# Altium footprint library Standard.PcbLib: 148 footprints (part 7 of 10)
Each footprint in its own frame and in the unit in brackets; x right, y up, seen from the top. Pads: shape width x height; smd on the part's side, far side on the other; paste and mask are expansions set on the pad; w line width, h text height; cw(c..) or ccw(c..) is an arc to the next point about the centre after c.
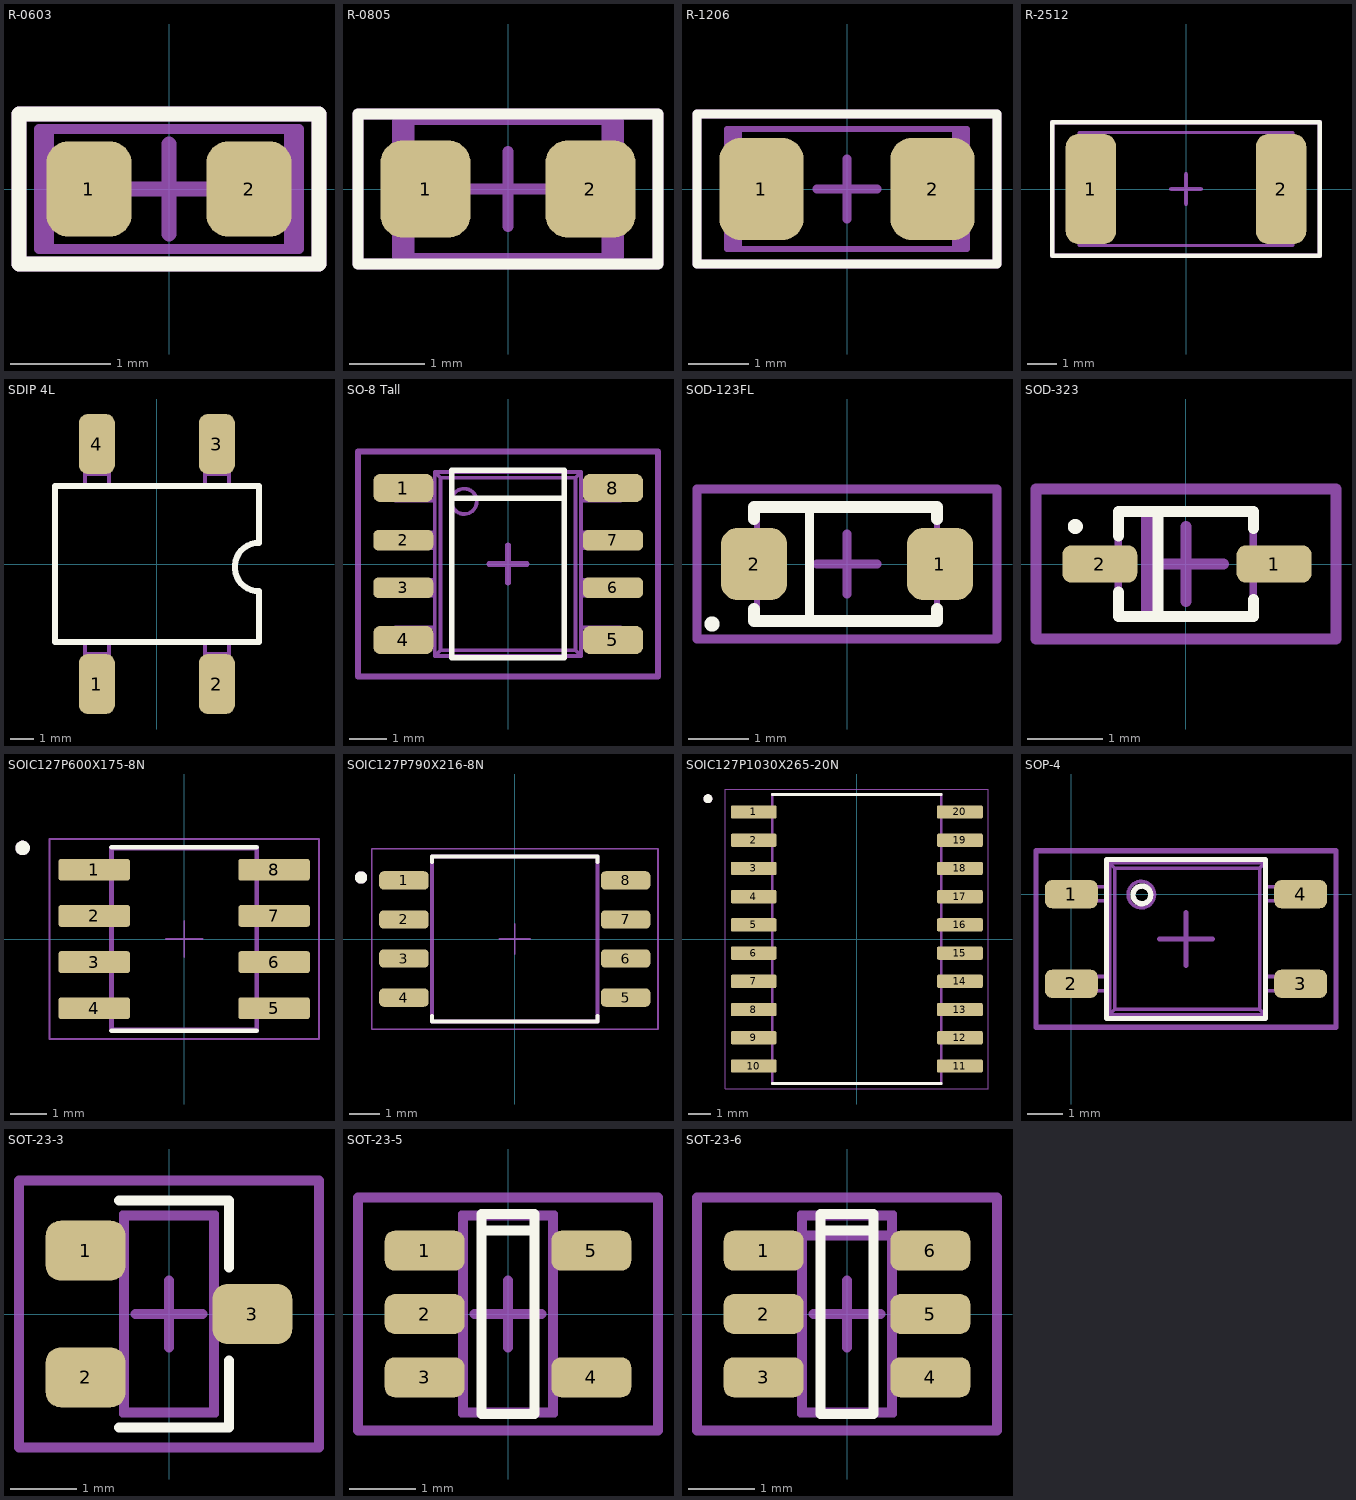
[diagram p6: the footprints below, top view; thin cyan lines are the x and y axes]

## R-0603 [mm] "Chip Capacitor, 2-Leads, Body 1,60x0,83mm, IPC Medium Density"
height 0.6
pads (2):
  rrect50% 0.85x0.95 smd: 1(-0.8,0) 2(0.8,0)
Top Overlay:
  lines w0.15: -1.5,-0.75 -1.5,0.75 0,0.75 1.5,0.75 1.5,-0.75 0,-0.75 -1.5,-0.75
Top Assembly:
  lines w0.1: -1.2,-0.6 -1.2,0.6 ; 1.2,-0.6 1.2,0.6 ; -1.3,-0.6 -1.3,0.6 1.3,0.6 1.3,-0.6 -1.3,-0.6
Top Component Outline:
  lines w0.15: -0.45,0 0.45,0 ; 0,-0.45 0,0.45 ; -1.5,-0.75 -1.5,0.75 1.5,0.75 1.5,-0.75 -1.5,-0.75
3D body "SMD R-0603.STEP": height 0.45, standoff -0.01, extent -0.8,-0.4 0.8,0.4

## R-0805 [mm] "Chip Resistor, 2-Leads, Body 2,00x1,25mm, IPC Medium Density"
height 0.7
pads (2):
  rrect50% 1.2x1.3 smd: 1(-1.1,0) 2(1.1,0)
Top Overlay:
  lines w0.15: -2,-1 -2,1 2,1 2,-1 -2,-1
Top Assembly:
  rectangle: 1.3,-0.9 1.5,0.9
  rectangle: -1.5,-0.9 -1.3,0.9
  lines w0.1: -1.3,-0.9 -1.3,0.9 ; 1.3,-0.9 1.3,0.9 ; -1.5,-0.9 1.5,-0.9 1.5,0.9 -1.5,0.9 -1.5,-0.9
Top Component Outline:
  lines w0.15: -0.5,0 0.5,0 ; 0,-0.5 0,0.5 ; -2,-1 -2,1 2,1 2,-1 -2,-1
3D body "R-0805.STEP": height 0.6, standoff 0, extent -1,-0.625 1,0.625

## R-1206 [mm] "Chip Resistor, 2-Leads, Body 3,20x1,60mm, IPC Medium Density"
height 0.7
pads (2):
  rrect50% 1.4x1.7 smd: 1(-1.425,0) 2(1.425,0)
Top Overlay:
  lines w0.15: -2.5,-1.25 -2.5,1.25 -0.45,1.25 0.45,1.25 2.5,1.25 2.5,-1.25 0.45,-1.25 -0.45,-1.25 -2.5,-1.25
Top Assembly:
  rectangle: 1.75,-1 1.95,1
  rectangle: -1.95,-1 -1.75,1
  lines w0.1: -2,-1 -2,1 2,1 2,-1 -2,-1
Top Component Outline:
  lines w0.15: -0.5,0 0.5,0 ; 0,-0.5 0,0.5 ; -2.5,-1.25 -2.5,1.25 2.5,1.25 2.5,-1.25 -2.5,-1.25
3D body "R-1206 (2).STEP": height 0.6, standoff 0, extent -1.6,-0.8 1.6,0.8

## R-2512 [mm]
height 0.7
pads (2):
  rrect50% 1.7x3.7 smd: 1(-3.2,0) 2(3.2,0)
Top Overlay:
  lines w0.15: -4.5,-2.25 4.5,-2.25 4.5,2.25 -4.5,2.25 -4.5,-2.25
Top Assembly:
  rectangle: -3.6,-1.9 -2.8,1.9
  rectangle: 2.8,-1.9 3.6,1.9
  lines w0.1: -3.3,-1.9 -3.3,1.9 ; 3.3,-1.9 3.3,1.9 ; -3.6,-1.9 3.6,-1.9 3.6,1.9 -3.6,1.9 -3.6,-1.9
Top Component Outline:
  lines w0.15: -0.5,0 0.5,0 ; 0,-0.5 0,0.5 ; -4.5,-2.25 4.5,-2.25 4.5,2.25 -4.5,2.25 -4.5,-2.25
3D body "SMD R-2512.STEP": height 0.62, standoff 0, extent -3.16,-1.6 3.16,1.6

## SDIP 4L [mil] "4-LEAD,SDIP,6.5mm WIDE"
pads (4):
  rrect50% 60x100 smd: 1(-100,-200) 2(100,-200) 3(100,200) 4(-100,200)
Top Overlay:
  lines w10: 170,-45.31 cw(c170,-5) 170,35.31 ; 170,-45 170,-130 -170,-130 -170,130 170,130 170,35
Top Assembly:
  lines w7.01: -120,-150 -80,-150 ; -120,-130 -120,-190 -80,-190 -80,-130 ; -120,130 -120,190 -80,190 -80,130 ; -120,150 -80,150 ; 80,-150 120,-150 ; 80,-130 80,-190 120,-190 120,-130 ; 80,130 80,190 120,190 120,130 ; 80,150 120,150 ; 170,-45.31 cw(c170,-5) 170,35.31 ; 170,-45 170,-130 -170,-130 -170,130 170,130 170,35
  text "~~" at -157.48,-157.48 h62.5
  text "-" at -140,40 h62.5
  text "~~" at 78.74,-157.48 h62.5
  text "+" at 60,40 h62.5
3D body "User Library-DFS.STEP": height 102.76, standoff 0.6, extent -161.42,-206.69 161.42,198.82

## SIP8-DQ [mm]

## SO-8 Tall [mm] "SOIC, 8-Leads, Body 4,90x3,90mm, Pitch 1,27mm, IPC Medium Density"
height 1.75
pads (8):
  rrect50% 1.6x0.75 smd: 1(-2.793,2.025) 4(-2.793,-2.025) 5(2.8,-2.025) 8(2.8,2.025)
  rrect50% 1.6x0.55 smd: 2(-2.793,0.635) 3(-2.793,-0.635) 6(2.8,-0.635) 7(2.8,0.635)
Top Overlay:
  lines w0.15: -1.5,1.75 1.5,1.75 ; -1.5,-2.5 -1.5,2.5 1.5,2.5 1.5,-2.5 -1.5,-2.5
Top Assembly:
  circle w0.1: c-1.17,1.67 r0.338
  lines w0.1: -2.631,-2.115 -2.543,-2.115 ; -2.631,-2.115 -3,-2.115 -3,-1.695 -2.631,-1.695 ; -2.631,-2.115 -2.631,-1.695 ; -2.631,-1.695 -2.543,-1.695 ; -2.631,-0.845 -2.543,-0.845 ; -2.631,-0.845 -3,-0.845 -3,-0.425 -2.631,-0.425 ; -2.631,-0.845 -2.631,-0.425 ; -2.631,-0.425 -2.543,-0.425 ; -2.631,0.425 -2.543,0.425 ; -2.631,0.425 -3,0.425 -3,0.845 -2.631,0.845 ; -2.631,0.425 -2.631,0.845 ; -2.631,0.845 -2.543,0.845 ; -2.631,1.695 -2.543,1.695 ; -2.631,1.695 -3,1.695 -3,2.115 -2.631,2.115 ; -2.631,1.695 -2.631,2.115 ; -2.631,2.115 -2.543,2.115 ; -2.543,-2.115 -2.403,-2.115 ; -2.543,-2.115 -2.543,-1.695 ; -2.543,-1.695 -2.403,-1.695 ; -2.543,-0.845 -2.403,-0.845 ; -2.543,-0.845 -2.543,-0.425 ; -2.543,-0.425 -2.403,-0.425 ; -2.543,0.425 -2.403,0.425 ; -2.543,0.425 -2.543,0.845 ; -2.543,0.845 -2.403,0.845 ; -2.543,1.695 -2.403,1.695 ; -2.543,1.695 -2.543,2.115 ; -2.543,2.115 -2.403,2.115 ; -2.403,-2.115 -2.113,-2.115 ; -2.403,-2.115 -2.403,-1.695 ; -2.403,-1.695 -2.113,-1.695 ; -2.403,-0.845 -2.113,-0.845 ; -2.403,-0.845 -2.403,-0.425 ; -2.403,-0.425 -2.113,-0.425 ; -2.403,0.425 -2.113,0.425 ; -2.403,0.425 -2.403,0.845 ; -2.403,0.845 -2.113,0.845 ; -2.403,1.695 -2.113,1.695 ; -2.403,1.695 -2.403,2.115 ; -2.403,2.115 -2.113,2.115 ; -2.113,-2.115 -1.95,-2.115 ; -2.113,-2.115 -2.113,-1.695 ; -2.113,-1.695 -1.95,-1.695 ; -2.113,-0.845 -1.95,-0.845 ; -2.113,-0.845 -2.113,-0.425 ; -2.113,-0.425 -1.95,-0.425 ; -2.113,0.425 -1.95,0.425 ; -2.113,0.425 -2.113,0.845 ; -2.113,0.845 -1.95,0.845 ; -2.113,1.695 -1.95,1.695 ; -2.113,1.695 -2.113,2.115 ; -2.113,2.115 -1.95,2.115 ; -1.95,-2.45 -1.801,-2.301 ; -1.95,-2.45 -1.95,-2.115 ; -1.95,-2.45 1.95,-2.45 ; -1.95,-2.115 -1.95,-1.695 ; -1.95,-1.695 -1.95,-0.845 ; -1.95,-0.845 -1.95,-0.425 ; -1.95,-0.425 -1.95,0.425 ; -1.95,0.425 -1.95,0.845 ; -1.95,0.845 -1.95,1.695 ; -1.95,1.695 -1.95,2.115 ; -1.95,2.115 -1.95,2.45 ; -1.95,2.45 1.95,2.45 ; -1.95,2.45 -1.801,2.301 ; -1.801,-2.301 -1.801,2.301 ; -1.801,-2.301 1.801,-2.301 ; -1.801,2.301 1.801,2.301 ; 1.801,-2.301 1.801,2.301 ; 1.801,-2.301 1.95,-2.45 ; 1.801,2.301 1.95,2.45 ; 1.95,-2.45 1.95,-2.115 ; 1.95,-2.115 1.95,-1.695 ; 1.95,-2.115 2.113,-2.115 ; 1.95,-1.695 1.95,-0.845 ; 1.95,-1.695 2.113,-1.695 ; 1.95,-0.845 1.95,-0.425 ; 1.95,-0.845 2.113,-0.845 ; 1.95,-0.425 1.95,0.425 ; 1.95,-0.425 2.113,-0.425 ; 1.95,0.425 1.95,0.845 ; 1.95,0.425 2.113,0.425 ; 1.95,0.845 1.95,1.695 ; 1.95,0.845 2.113,0.845 ; 1.95,1.695 1.95,2.115 ; 1.95,1.695 2.113,1.695 ; 1.95,2.115 1.95,2.45 ; 1.95,2.115 2.113,2.115 ; 2.113,-2.115 2.403,-2.115 ; 2.113,-2.115 2.113,-1.695 ; 2.113,-1.695 2.403,-1.695 ; 2.113,-0.845 2.403,-0.845 ; 2.113,-0.845 2.113,-0.425 ; 2.113,-0.425 2.403,-0.425 ; 2.113,0.425 2.403,0.425 ; 2.113,0.425 2.113,0.845 ; 2.113,0.845 2.403,0.845 ; 2.113,1.695 2.403,1.695 ; 2.113,1.695 2.113,2.115 ; 2.113,2.115 2.403,2.115 ; 2.403,-2.115 2.543,-2.115 ; 2.403,-2.115 2.403,-1.695 ; 2.403,-1.695 2.543,-1.695 ; 2.403,-0.845 2.543,-0.845 ; 2.403,-0.845 2.403,-0.425 ; 2.403,-0.425 2.543,-0.425 ; 2.403,0.425 2.543,0.425 ; 2.403,0.425 2.403,0.845 ; 2.403,0.845 2.543,0.845 ; 2.403,1.695 2.543,1.695 ; 2.403,1.695 2.403,2.115 ; 2.403,2.115 2.543,2.115 ; 2.543,-2.115 2.631,-2.115 ; 2.543,-2.115 2.543,-1.695 ; 2.543,-1.695 2.631,-1.695 ; 2.543,-0.845 2.631,-0.845 ; 2.543,-0.845 2.543,-0.425 ; 2.543,-0.425 2.631,-0.425 ; 2.543,0.425 2.631,0.425 ; 2.543,0.425 2.543,0.845 ; 2.543,0.845 2.631,0.845 ; 2.543,1.695 2.631,1.695 ; 2.543,1.695 2.543,2.115 ; 2.543,2.115 2.631,2.115 ; 2.631,-2.115 3,-2.115 3,-1.695 2.631,-1.695 ; 2.631,-2.115 2.631,-1.695 ; 2.631,-0.845 3,-0.845 3,-0.425 2.631,-0.425 ; 2.631,-0.845 2.631,-0.425 ; 2.631,0.425 3,0.425 3,0.845 2.631,0.845 ; 2.631,0.425 2.631,0.845 ; 2.631,1.695 3,1.695 3,2.115 2.631,2.115 ; 2.631,1.695 2.631,2.115
Top Component Outline:
  lines w0.15: -0.5,0 0.5,0 ; 0,-0.5 0,0.5 ; -4,-3 -4,3 4,3 4,-3 -4,-3
3D body "User Library-SO8-HCPL.STEP": height 3.28, standoff -0.45, extent -3.003,-2.5 3.003,2.5

## SOD-123FL [mm] "SODFL, 2-Leads, Body 1,70x3,60mm, IPC Medium Density"
height 1.3
pads (2):
  rrect50% 1.1x1.2 smd: 1(1.55,0) 2(-1.55,0)
Top Overlay:
  circle w0.15: c-2.25,-1 r0.05
  lines w0.15: -0.625,-0.95 -0.625,0.95
  lines w0.2: -1.55,-0.75 -1.55,-0.95 1.5,-0.95 1.5,-0.75 ; -1.55,0.75 -1.55,0.95 1.5,0.95 1.5,0.75
Top Assembly:
  lines w0.1: -0.625,-0.9 -0.625,0.9 ; -1.5,-0.9 1.5,-0.9 1.5,0.9 -1.5,0.9 -1.5,-0.9
Top Component Outline:
  lines w0.15: -0.5,0 0.5,0 ; 0,-0.5 0,0.5 ; -2.5,-1.25 2.5,-1.25 2.5,1.25 -2.5,1.25 -2.5,-1.25
3D body "SODFL360X130-2N.step": height 1.3, standoff 0, extent -1.8,-0.9 1.8,0.9

## SOD-323 [mm] "SOD-323 SODFL, 2-Leads, Body 1,30x2,60mm, IPC Medium Density"
height 1
pads (2):
  rrect50% 1x0.5 smd: 1(1.175,0) 2(-1.15,0)
Top Overlay:
  circle w0.1: c-1.475,0.5 r0.05
  lines w0.15: -0.9,-0.375 -0.9,-0.7 0.9,-0.7 0.9,-0.475 ; -0.9,0.375 -0.9,0.7 0.9,0.7 0.9,0.475 ; -0.375,-0.7 -0.375,0.7
Top Assembly:
  region: -0.375,-0.7 -0.375,0.7 -0.6,0.7 -0.6,-0.7
  lines w0.1: -0.375,-0.7 -0.375,0.7 ; -1.274,-0.15 -1.183,-0.15 ; -1.274,-0.15 -1.446,-0.15 -1.446,0.15 -1.274,0.15 ; -1.274,-0.15 -1.274,0.15 ; -1.274,0.15 -1.183,0.15 ; -1.183,-0.15 -1.171,-0.15 ; -1.183,-0.15 -1.183,0.15 ; -1.183,0.15 -1.171,0.15 ; -1.171,-0.15 -0.921,-0.15 ; -1.171,-0.15 -1.171,0.15 ; -1.171,0.15 -0.921,0.15 ; -0.921,-0.15 -0.9,-0.15 -0.9,0.15 -0.921,0.15 ; -0.921,-0.15 -0.921,0.15 ; 0.921,-0.15 1.171,-0.15 ; 0.921,-0.15 0.9,-0.15 0.9,0.15 0.921,0.15 ; 0.921,-0.15 0.921,0.15 ; 0.921,0.15 1.171,0.15 ; 1.171,-0.15 1.183,-0.15 ; 1.171,-0.15 1.171,0.15 ; 1.171,0.15 1.183,0.15 ; 1.183,-0.15 1.274,-0.15 ; 1.183,-0.15 1.183,0.15 ; 1.183,0.15 1.274,0.15 ; 1.274,-0.15 1.446,-0.15 1.446,0.15 1.274,0.15 ; 1.274,-0.15 1.274,0.15 ; -0.9,-0.7 -0.9,0.7 0.9,0.7 0.9,-0.7 -0.9,-0.7
Top Component Outline:
  lines w0.15: -0.5,0 0.5,0 ; 0,-0.5 0,0.5 ; -2,-1 -2,1 2,1 2,-1 -2,-1
3D body "SOD-323.STEP": height 1.1, standoff 0, extent -1.295,-0.675 1.305,0.675

## SOIC127P600X175-8N [mm]
pads (8):
  rrect25% 1.97x0.6 smd: 1(-2.475,1.905) 2(-2.475,0.635) 3(-2.475,-0.635) 4(-2.475,-1.905) 5(2.475,-1.905) 6(2.475,-0.635) 7(2.475,0.635) 8(2.475,1.905)
Top Overlay:
  circle w0.2: c-4.445,2.505 r0.1
  lines w0.127: -2,-2.525 2,-2.525 ; -2,2.525 2,2.525
Top Assembly:
  circle w0.2: c-4.445,2.505 r0.1
  lines w0.127: -2,-2.5 -2,2.5 2,2.5 2,-2.5 -2,-2.5
Top Component Outline:
  lines w0.05: -0.5,0 0.5,0 ; 0,-0.5 0,0.5 ; -3.71,-2.75 -3.71,2.75 3.71,2.75 3.71,-2.75 -3.71,-2.75
3D body "User Library-SOIC-8-1.step": height 1.75, standoff 0, extent -3,-2.45 3,2.45

## SOIC127P790X216-8N [mm]
pads (8):
  rrect50% 1.61x0.6 smd: 1(-3.605,1.905) 2(-3.605,0.635) 3(-3.605,-0.635) 4(-3.605,-1.905) 5(3.605,-1.905) 6(3.605,-0.635) 7(3.605,0.635) 8(3.605,1.905)
Top Overlay:
  circle w0.2: c-5,2 r0.1
  lines w0.127: -2.69,-2.51 -2.69,-2.69 2.69,-2.69 2.69,-2.51 ; -2.69,2.51 -2.69,2.69 2.69,2.69 2.69,2.51
Top Assembly:
  circle w0.2: c-5,2 r0.1
  lines w0.127: -2.69,-2.69 2.69,-2.69 2.69,2.69 -2.69,2.69 -2.69,-2.69
Top Component Outline:
  lines w0.05: -0.5,0 0.5,0 ; 0,-0.5 0,0.5 ; -4.66,-2.94 4.66,-2.94 4.66,2.94 -4.66,2.94 -4.66,-2.94
3D body "User Library-SOIC8_Wide_5mmx5mm.STEP": height 1.75, standoff -0.01, extent -4.052,-2.73 4.05,2.73

## SOIC127P1030X265-20N [mm]
pads (20):
  rrect25% 2.06x0.6 smd: 1(-4.64,5.715) 2(-4.64,4.445) 3(-4.64,3.175) 4(-4.64,1.905) 5(-4.64,0.635) 6(-4.64,-0.635) 7(-4.64,-1.905) 8(-4.64,-3.175) 9(-4.64,-4.445) 10(-4.64,-5.715) 11(4.64,-5.715) 12(4.64,-4.445) 13(4.64,-3.175) 14(4.64,-1.905) 15(4.64,-0.635) 16(4.64,0.635) 17(4.64,1.905) 18(4.64,3.175) 19(4.64,4.445) 20(4.64,5.715)
Top Overlay:
  circle w0.2: c-6.7,6.315 r0.1
  lines w0.127: -3.8,-6.5 3.8,-6.5 ; -3.8,6.5 3.8,6.5
Top Assembly:
  circle w0.2: c-6.7,6.315 r0.1
  lines w0.127: -3.8,-6.5 -3.8,6.5 3.8,6.5 3.8,-6.5 -3.8,-6.5
Top Component Outline:
  lines w0.05: -5.92,-6.75 -5.92,6.75 5.92,6.75 5.92,-6.75 -5.92,-6.75
3D body "SO20 Wide 7.50mm.step": height 2.65, standoff 0, extent -5.15,-6.42 5.15,6.42

## SOP-4 [mm]
pads (4):
  rrect50% 1.5x0.8 smd: 1(0,0) 2(0,-2.54) 3(6.5,-2.54) 4(6.5,0)
Top Overlay:
  circle w0.15: c2,-0.02 r0.25
  lines w0.15: 1,-3.52 5.5,-3.52 5.5,0.98 1,0.98 1,-3.52
Top Assembly:
  circle w0.1: c1.983,-0.012 r0.375
  lines w0.1: 0.233,-2.732 0.233,-2.332 ; 0.233,-2.732 -0.117,-2.732 -0.117,-2.332 0.233,-2.332 ; 0.233,-2.732 0.383,-2.732 ; 0.233,-2.332 0.383,-2.332 ; 0.233,-0.192 0.233,0.208 ; 0.233,-0.192 -0.117,-0.192 -0.117,0.208 0.233,0.208 ; 0.233,-0.192 0.383,-0.192 ; 0.233,0.208 0.383,0.208 ; 0.383,-2.732 0.683,-2.732 ; 0.383,-2.732 0.383,-2.332 ; 0.383,-2.332 0.683,-2.332 ; 0.383,-0.192 0.683,-0.192 ; 0.383,-0.192 0.383,0.208 ; 0.383,0.208 0.683,0.208 ; 0.683,-2.732 0.683,-2.332 ; 0.683,-2.732 1.083,-2.732 1.083,-2.332 0.683,-2.332 ; 0.683,-0.192 0.683,0.208 ; 0.683,-0.192 1.083,-0.192 1.083,0.208 0.683,0.208 ; 1.083,-3.412 5.483,-3.412 ; 1.083,-3.412 1.083,0.888 ; 1.083,-3.412 1.233,-3.262 ; 1.083,0.888 5.483,0.888 ; 1.083,0.888 1.233,0.738 ; 1.233,-3.262 5.333,-3.262 ; 1.233,-3.262 1.233,0.738 ; 1.233,0.738 5.333,0.738 ; 5.333,-3.262 5.333,0.738 ; 5.333,-3.262 5.483,-3.412 ; 5.333,0.738 5.483,0.888 ; 5.483,-3.412 5.483,0.888 ; 5.883,-2.732 5.883,-2.332 ; 5.883,-2.732 6.183,-2.732 ; 5.883,-2.732 5.483,-2.732 5.483,-2.332 5.883,-2.332 ; 5.883,-2.332 6.183,-2.332 ; 5.883,-0.192 5.883,0.208 ; 5.883,-0.192 6.183,-0.192 ; 5.883,-0.192 5.483,-0.192 5.483,0.208 5.883,0.208 ; 5.883,0.208 6.183,0.208 ; 6.183,-2.732 6.333,-2.732 ; 6.183,-2.732 6.183,-2.332 ; 6.183,-2.332 6.333,-2.332 ; 6.183,-0.192 6.333,-0.192 ; 6.183,-0.192 6.183,0.208 ; 6.183,0.208 6.333,0.208 ; 6.333,-2.732 6.333,-2.332 ; 6.333,-2.732 6.683,-2.732 6.683,-2.332 6.333,-2.332 ; 6.333,-0.192 6.333,0.208 ; 6.333,-0.192 6.683,-0.192 6.683,0.208 6.333,0.208
Top Component Outline:
  lines w0.15: 2.5,-1.27 4,-1.27 ; 3.25,-2.02 3.25,-0.52 ; -1,-3.77 7.5,-3.77 7.5,1.23 -1,1.23 -1,-3.77
3D body "User Library-4-SOP.STEP": height 2.1, standoff 0, extent -0.15,-3.42 6.65,0.88

## SOT-23-3 [mm] "SOT23, 3-Leads, Body 2,90x2,30mm, Pitch 0,95mm, IPC Medium Density"
height 1.1
pads (3):
  rrect50% 1.2x0.9 smd: 1(-1.25,0.95) 2(-1.25,-0.95) 3(1.25,0)
Top Overlay:
  lines w0.15: -0.75,-1.7 0.9,-1.7 0.9,-0.7 ; -0.75,1.7 0.9,1.7 0.9,0.7
Top Assembly:
  lines w0.1: -1.25,-1.175 -1.027,-1.175 ; -1.25,-1.175 -1.25,-0.725 ; -1.25,-1.175 -1.25,-0.725 ; -1.25,-1.175 -0.7,-1.175 ; -1.25,-0.725 -1.027,-0.725 ; -1.25,-0.725 -0.7,-0.725 ; -1.25,0.725 -1.027,0.725 ; -1.25,0.725 -1.25,1.175 ; -1.25,0.725 -0.7,0.725 ; -1.25,0.725 -1.25,1.175 ; -1.25,1.175 -1.027,1.175 ; -1.25,1.175 -0.7,1.175 ; -1.027,-1.175 -1.027,-0.725 ; -1.027,-1.175 -0.977,-1.175 ; -1.027,-0.725 -0.977,-0.725 ; -1.027,0.725 -1.027,1.175 ; -1.027,0.725 -0.977,0.725 ; -1.027,1.175 -0.977,1.175 ; -0.977,-1.175 -0.977,-0.725 ; -0.977,-1.175 -0.955,-1.175 ; -0.977,-0.725 -0.955,-0.725 ; -0.977,0.725 -0.977,1.175 ; -0.977,0.725 -0.955,0.725 ; -0.977,1.175 -0.955,1.175 ; -0.955,-1.175 -0.955,-0.725 ; -0.955,-1.175 -0.757,-1.175 ; -0.955,-0.725 -0.757,-0.725 ; -0.955,0.725 -0.955,1.175 ; -0.955,0.725 -0.757,0.725 ; -0.955,1.175 -0.757,1.175 ; -0.757,-1.175 -0.757,-0.725 ; -0.757,-1.175 -0.7,-1.175 ; -0.757,-0.725 -0.7,-0.725 ; -0.757,0.725 -0.757,1.175 ; -0.757,0.725 -0.7,0.725 ; -0.757,1.175 -0.7,1.175 ; -0.7,-1.5 -0.7,-1.175 ; -0.7,-1.5 0.7,-1.5 ; -0.7,-1.5 -0.652,-1.452 ; -0.7,-1.5 0.7,-1.5 ; -0.7,-1.5 -0.7,-1.175 ; -0.7,-1.175 -0.7,-0.725 ; -0.7,-0.725 -0.7,0.725 ; -0.7,-0.725 -0.7,0.725 ; -0.7,0.725 -0.7,1.175 ; -0.7,1.175 -0.7,1.5 ; -0.7,1.175 -0.7,1.5 ; -0.7,1.5 0.7,1.5 ; -0.7,1.5 -0.652,1.452 ; -0.7,1.5 0.7,1.5 ; -0.652,-1.452 -0.652,1.452 ; -0.652,-1.452 0.652,-1.452 ; -0.652,1.452 0.652,1.452 ; 0.652,-1.452 0.652,1.452 ; 0.652,-1.452 0.7,-1.5 ; 0.652,1.452 0.7,1.5 ; 0.7,-1.5 0.7,-0.225 ; 0.7,-1.5 0.7,-0.225 ; 0.7,-0.225 0.757,-0.225 ; 0.7,-0.225 0.7,0.225 ; 0.7,-0.225 1.25,-0.225 ; 0.7,0.225 0.757,0.225 ; 0.7,0.225 0.7,1.5 ; 0.7,0.225 0.7,1.5 ; 0.7,0.225 1.25,0.225 ; 0.757,-0.225 0.757,0.225 ; 0.757,-0.225 0.955,-0.225 ; 0.757,0.225 0.955,0.225 ; 0.955,-0.225 0.955,0.225 ; 0.955,-0.225 0.977,-0.225 ; 0.955,0.225 0.977,0.225 ; 0.977,-0.225 0.977,0.225 ; 0.977,-0.225 1.027,-0.225 ; 0.977,0.225 1.027,0.225 ; 1.027,-0.225 1.027,0.225 ; 1.027,-0.225 1.25,-0.225 ; 1.027,0.225 1.25,0.225 ; 1.25,-0.225 1.25,0.225 ; 1.25,-0.225 1.25,0.225
Top Component Outline:
  lines w0.15: -0.5,0 0.5,0 ; 0,-0.5 0,0.5 ; -2.25,-2 -2.25,2 2.25,2 2.25,-2 -2.25,-2
3D body "SOT-23 3.STEP": height 1, standoff -0.02, extent -1.269,-1.46 1.207,1.46

## SOT-23-5 [mm] "SOT23, 5-Leads, Body 2,90x2,30mm, Pitch 0,95mm, IPC Medium Density"
height 1.1
pads (5):
  rrect50% 1.2x0.6 smd: 1(-1.25,0.95) 2(-1.25,0) 3(-1.25,-0.95) 4(1.25,-0.95) 5(1.25,0.95)
Top Overlay:
  lines w0.15: -0.4,1.25 -0.4,1.5 0.4,1.5 0.4,1.25 ; -0.4,1.25 0.4,1.25 ; -0.4,1.25 -0.4,-1.5 0.4,-1.5 0.4,1.25
Top Assembly:
  lines w0.1: -1.25,-1.175 -1.027,-1.175 ; -1.25,-1.175 -1.25,-0.725 ; -1.25,-1.175 -1.25,-0.725 ; -1.25,-1.175 -0.7,-1.175 ; -1.25,-0.725 -1.027,-0.725 ; -1.25,-0.725 -0.7,-0.725 ; -1.25,-0.225 -1.027,-0.225 ; -1.25,-0.225 -0.7,-0.225 ; -1.25,-0.225 -1.25,0.225 ; -1.25,-0.225 -1.25,0.225 ; -1.25,0.225 -1.027,0.225 ; -1.25,0.225 -0.7,0.225 ; -1.25,0.725 -1.027,0.725 ; -1.25,0.725 -1.25,1.175 ; -1.25,0.725 -0.7,0.725 ; -1.25,0.725 -1.25,1.175 ; -1.25,1.175 -1.027,1.175 ; -1.25,1.175 -0.7,1.175 ; -1.027,-1.175 -1.027,-0.725 ; -1.027,-1.175 -0.977,-1.175 ; -1.027,-0.725 -0.977,-0.725 ; -1.027,-0.225 -0.977,-0.225 ; -1.027,-0.225 -1.027,0.225 ; -1.027,0.225 -0.977,0.225 ; -1.027,0.725 -1.027,1.175 ; -1.027,0.725 -0.977,0.725 ; -1.027,1.175 -0.977,1.175 ; -0.977,-1.175 -0.977,-0.725 ; -0.977,-1.175 -0.955,-1.175 ; -0.977,-0.725 -0.955,-0.725 ; -0.977,-0.225 -0.955,-0.225 ; -0.977,-0.225 -0.977,0.225 ; -0.977,0.225 -0.955,0.225 ; -0.977,0.725 -0.977,1.175 ; -0.977,0.725 -0.955,0.725 ; -0.977,1.175 -0.955,1.175 ; -0.955,-1.175 -0.955,-0.725 ; -0.955,-1.175 -0.757,-1.175 ; -0.955,-0.725 -0.757,-0.725 ; -0.955,-0.225 -0.757,-0.225 ; -0.955,-0.225 -0.955,0.225 ; -0.955,0.225 -0.757,0.225 ; -0.955,0.725 -0.955,1.175 ; -0.955,0.725 -0.757,0.725 ; -0.955,1.175 -0.757,1.175 ; -0.757,-1.175 -0.757,-0.725 ; -0.757,-1.175 -0.7,-1.175 ; -0.757,-0.725 -0.7,-0.725 ; -0.757,-0.225 -0.7,-0.225 ; -0.757,-0.225 -0.757,0.225 ; -0.757,0.225 -0.7,0.225 ; -0.757,0.725 -0.757,1.175 ; -0.757,0.725 -0.7,0.725 ; -0.757,1.175 -0.7,1.175 ; -0.7,-1.5 -0.7,-1.175 ; -0.7,-1.5 -0.652,-1.452 ; -0.7,-1.5 -0.7,-1.175 ; -0.7,-1.5 0.7,-1.5 ; -0.7,-1.5 0.7,-1.5 ; -0.7,-1.175 -0.7,-0.725 ; -0.7,-0.725 -0.7,-0.225 ; -0.7,-0.725 -0.7,-0.225 ; -0.7,-0.225 -0.7,0.225 ; -0.7,0.225 -0.7,0.725 ; -0.7,0.225 -0.7,0.725 ; -0.7,0.725 -0.7,1.175 ; -0.7,1.175 -0.7,1.5 ; -0.7,1.175 -0.7,1.5 ; -0.7,1.5 -0.652,1.452 ; -0.7,1.5 0.7,1.5 ; -0.7,1.5 0.7,1.5 ; -0.652,-1.452 -0.652,1.452 ; -0.652,-1.452 0.652,-1.452 ; -0.652,1.452 0.652,1.452 ; 0.652,-1.452 0.7,-1.5 ; 0.652,-1.452 0.652,1.452 ; 0.652,1.452 0.7,1.5 ; 0.7,-1.5 0.7,-1.175 ; 0.7,-1.5 0.7,-1.175 ; 0.7,-1.175 0.757,-1.175 ; 0.7,-1.175 0.7,-0.725 ; 0.7,-1.175 1.25,-1.175 ; 0.7,-0.725 0.757,-0.725 ; 0.7,-0.725 1.25,-0.725 ; 0.7,-0.725 0.7,0.725 ; 0.7,-0.725 0.7,0.725 ; 0.7,0.725 0.757,0.725 ; 0.7,0.725 0.7,1.175 ; 0.7,0.725 1.25,0.725 ; 0.7,1.175 0.757,1.175 ; 0.7,1.175 0.7,1.5 ; 0.7,1.175 1.25,1.175 ; 0.7,1.175 0.7,1.5 ; 0.757,-1.175 0.757,-0.725 ; 0.757,-1.175 0.955,-1.175 ; 0.757,-0.725 0.955,-0.725 ; 0.757,0.725 0.757,1.175 ; 0.757,0.725 0.955,0.725 ; 0.757,1.175 0.955,1.175 ; 0.955,-1.175 0.955,-0.725 ; 0.955,-1.175 0.977,-1.175 ; 0.955,-0.725 0.977,-0.725 ; 0.955,0.725 0.955,1.175 ; 0.955,0.725 0.977,0.725 ; 0.955,1.175 0.977,1.175 ; 0.977,-1.175 0.977,-0.725 ; 0.977,-1.175 1.027,-1.175 ; 0.977,-0.725 1.027,-0.725 ; 0.977,0.725 0.977,1.175 ; 0.977,0.725 1.027,0.725 ; 0.977,1.175 1.027,1.175 ; 1.027,-1.175 1.027,-0.725 ; 1.027,-1.175 1.25,-1.175 ; 1.027,-0.725 1.25,-0.725 ; 1.027,0.725 1.027,1.175 ; 1.027,0.725 1.25,0.725 ; 1.027,1.175 1.25,1.175 ; 1.25,-1.175 1.25,-0.725 ; 1.25,-1.175 1.25,-0.725 ; 1.25,0.725 1.25,1.175 ; 1.25,0.725 1.25,1.175
Top Component Outline:
  lines w0.15: -0.5,0 0.5,0 ; 0,-0.5 0,0.5 ; -2.25,-1.75 -2.25,1.75 2.25,1.75 2.25,-1.75 -2.25,-1.75
3D body "SOT95P245X110-5N.step": height 1.1, standoff 0, extent -1.3,-1.5 1.3,1.5

## SOT-23-6 [mm] "SOT23, 6-Leads, Body 2,90x2,30mm, Pitch 0,95mm, IPC Medium Density"
height 1.1
pads (6):
  rrect50% 1.2x0.6 smd: 1(-1.25,0.95) 2(-1.25,0) 3(-1.25,-0.95) 4(1.25,-0.95) 5(1.25,0) 6(1.25,0.95)
Top Overlay:
  lines w0.15: -0.4,1.25 -0.4,1.5 0.4,1.5 0.4,1.25 ; -0.4,1.25 0.4,1.25 ; -0.4,1.25 -0.4,-1.5 0.4,-1.5 0.4,1.25
Top Assembly:
  lines w0.1: -1.25,-1.175 -1.027,-1.175 ; -1.25,-1.175 -1.25,-0.725 ; -1.25,-1.175 -1.25,-0.725 ; -1.25,-1.175 -0.7,-1.175 ; -1.25,-0.725 -1.027,-0.725 ; -1.25,-0.725 -0.7,-0.725 ; -1.25,-0.225 -1.027,-0.225 ; -1.25,-0.225 -1.25,0.225 ; -1.25,-0.225 -0.7,-0.225 ; -1.25,-0.225 -1.25,0.225 ; -1.25,0.225 -1.027,0.225 ; -1.25,0.225 -0.7,0.225 ; -1.25,0.725 -1.027,0.725 ; -1.25,0.725 -1.25,1.175 ; -1.25,0.725 -0.7,0.725 ; -1.25,0.725 -1.25,1.175 ; -1.25,1.175 -1.027,1.175 ; -1.25,1.175 -0.7,1.175 ; -1.027,-1.175 -1.027,-0.725 ; -1.027,-1.175 -0.977,-1.175 ; -1.027,-0.725 -0.977,-0.725 ; -1.027,-0.225 -1.027,0.225 ; -1.027,-0.225 -0.977,-0.225 ; -1.027,0.225 -0.977,0.225 ; -1.027,0.725 -1.027,1.175 ; -1.027,0.725 -0.977,0.725 ; -1.027,1.175 -0.977,1.175 ; -0.977,-1.175 -0.977,-0.725 ; -0.977,-1.175 -0.955,-1.175 ; -0.977,-0.725 -0.955,-0.725 ; -0.977,-0.225 -0.977,0.225 ; -0.977,-0.225 -0.955,-0.225 ; -0.977,0.225 -0.955,0.225 ; -0.977,0.725 -0.977,1.175 ; -0.977,0.725 -0.955,0.725 ; -0.977,1.175 -0.955,1.175 ; -0.955,-1.175 -0.955,-0.725 ; -0.955,-1.175 -0.757,-1.175 ; -0.955,-0.725 -0.757,-0.725 ; -0.955,-0.225 -0.955,0.225 ; -0.955,-0.225 -0.757,-0.225 ; -0.955,0.225 -0.757,0.225 ; -0.955,0.725 -0.955,1.175 ; -0.955,0.725 -0.757,0.725 ; -0.955,1.175 -0.757,1.175 ; -0.757,-1.175 -0.757,-0.725 ; -0.757,-1.175 -0.7,-1.175 ; -0.757,-0.725 -0.7,-0.725 ; -0.757,-0.225 -0.757,0.225 ; -0.757,-0.225 -0.7,-0.225 ; -0.757,0.225 -0.7,0.225 ; -0.757,0.725 -0.757,1.175 ; -0.757,0.725 -0.7,0.725 ; -0.757,1.175 -0.7,1.175 ; -0.7,-1.5 0.7,-1.5 ; -0.7,-1.5 -0.7,-1.175 ; -0.7,-1.5 -0.652,-1.452 ; -0.7,-1.5 -0.7,-1.175 ; -0.7,-1.5 0.7,-1.5 ; -0.7,-1.175 -0.7,-0.725 ; -0.7,-0.725 -0.7,-0.225 ; -0.7,-0.725 -0.7,-0.225 ; -0.7,-0.225 -0.7,0.225 ; -0.7,0.225 -0.7,0.725 ; -0.7,0.225 -0.7,0.725 ; -0.7,0.725 -0.7,1.175 ; -0.7,1.175 -0.7,1.5 ; -0.7,1.175 -0.7,1.5 ; -0.7,1.5 0.7,1.5 ; -0.7,1.5 -0.652,1.452 ; -0.7,1.5 0.7,1.5 ; -0.652,-1.452 0.652,-1.452 ; -0.652,-1.452 -0.652,1.452 ; -0.652,1.452 0.652,1.452 ; 0.652,-1.452 0.652,1.452 ; 0.652,-1.452 0.7,-1.5 ; 0.652,1.452 0.7,1.5 ; 0.7,-1.5 0.7,-1.175 ; 0.7,-1.5 0.7,-1.175 ; 0.7,-1.175 0.757,-1.175 ; 0.7,-1.175 0.7,-0.725 ; 0.7,-1.175 1.25,-1.175 ; 0.7,-0.725 0.757,-0.725 ; 0.7,-0.725 0.7,0.725 ; 0.7,-0.725 1.25,-0.725 ; 0.7,-0.725 0.7,0.725 ; 0.7,-0.225 1.25,-0.225 ; 0.7,-0.225 0.7,0.225 ; 0.7,-0.225 0.757,-0.225 ; 0.7,0.225 1.25,0.225 ; 0.7,0.225 0.757,0.225 ; 0.7,0.725 0.757,0.725 ; 0.7,0.725 0.7,1.175 ; 0.7,0.725 1.25,0.725 ; 0.7,1.175 0.757,1.175 ; 0.7,1.175 0.7,1.5 ; 0.7,1.175 1.25,1.175 ; 0.7,1.175 0.7,1.5 ; 0.757,-1.175 0.757,-0.725 ; 0.757,-1.175 0.955,-1.175 ; 0.757,-0.725 0.955,-0.725 ; 0.757,-0.225 0.955,-0.225 ; 0.757,-0.225 0.757,0.225 ; 0.757,0.225 0.955,0.225 ; 0.757,0.725 0.757,1.175 ; 0.757,0.725 0.955,0.725 ; 0.757,1.175 0.955,1.175 ; 0.955,-1.175 0.955,-0.725 ; 0.955,-1.175 0.977,-1.175 ; 0.955,-0.725 0.977,-0.725 ; 0.955,-0.225 0.977,-0.225 ; 0.955,-0.225 0.955,0.225 ; 0.955,0.225 0.977,0.225 ; 0.955,0.725 0.955,1.175 ; 0.955,0.725 0.977,0.725 ; 0.955,1.175 0.977,1.175 ; 0.977,-1.175 0.977,-0.725 ; 0.977,-1.175 1.027,-1.175 ; 0.977,-0.725 1.027,-0.725 ; 0.977,-0.225 1.027,-0.225 ; 0.977,-0.225 0.977,0.225 ; 0.977,0.225 1.027,0.225 ; 0.977,0.725 0.977,1.175 ; 0.977,0.725 1.027,0.725 ; 0.977,1.175 1.027,1.175 ; 1.027,-1.175 1.027,-0.725 ; 1.027,-1.175 1.25,-1.175 ; 1.027,-0.725 1.25,-0.725 ; 1.027,-0.225 1.25,-0.225 ; 1.027,-0.225 1.027,0.225 ; 1.027,0.225 1.25,0.225 ; 1.027,0.725 1.027,1.175 ; 1.027,0.725 1.25,0.725 ; 1.027,1.175 1.25,1.175 ; 1.25,-1.175 1.25,-0.725 ; 1.25,-1.175 1.25,-0.725 ; 1.25,-0.225 1.25,0.225 ; 1.25,-0.225 1.25,0.225 ; 1.25,0.725 1.25,1.175 ; 1.25,0.725 1.25,1.175
  lines w0.15: -0.7,1.175 0.7,1.175
Top Component Outline:
  lines w0.15: -0.5,0 0.5,0 ; 0,-0.5 0,0.5 ; -2.25,-1.75 -2.25,1.75 2.25,1.75 2.25,-1.75 -2.25,-1.75
3D body "User Library-SOT23-6.step": height 1.3, standoff 0, extent -1.5,-1.5 1.5,1.5